# Altium schematic symbol library Minh_Lib.SchLib: 619 symbols (part 2 of 4) (continued)
## CDRH127NP-120MC
designator H?  Supplier Part Number 1: 308-1459-1-ND
Ind Power Shielded Wirewound 12uH 20% 1KHz Ferrite 4.9A Carrier T/R; Manufacturer: Sumida; Manufacturer Part Number: CDRH127NP-120MC; DC Resistance (DCR): 24.3mR; Supplier 1: Digi-Key; RoHS: Yes; Category: Fixed Inductors; Stock 1: 8232; Pricing 1: 1=2.10000, 10=1.93400, 25=1.77280, 50=1.51500, 100=1.35390, 250=1.16048 (USD); Mount: Surface Mount; Case/Package: Nonstandard; Core Material: Ferrite; Weight: 0.126986oz; Min Operating Temperature: -40°C; Max Operating Temperature: 100°C; Tolerance: 20%; Shielding: Shielded; Package Quantity: 1; Packaging: Tape and Reel; Current Rating: 4.9A; Inductance: 12uH; Max DC Current: 4.9A; Termination: SMD/SMT; Test Frequency: 1kHz; DC Current: 4.9A; Series: CDRH127; Rated Current-Max: 4.9A; Length: 12.3mm; Width: 12.3mm; Height: 8mm; Height - Seated (Max): 0.315inch; Depth: 12.3mm; Radiation Hardening: No; Military Standard: Not; Lead Free: Lead Free; RoHS Compliant: Yes; ComponentLink1URL: https://datasheet.ciiva.com/18168/getdatasheetpartid-357348-18168762.pdf?src-supplier=Verical; ComponentLink1Description: https://datasheet.ciiva.com/18168/getdatasheetpartid-357348-18168762.pdf?src-supplier=Verical
footprint CDRH127NP (Inductor)
pins: 1, 2

## CDRH127NP-121MC
designator H?  Supplier Part Number 1: 308-1460-1-ND
Ind Power Shielded Wirewound 120uH 20% 1KHz Ferrite 1.6A Carrier T/R; Manufacturer: Sumida; Manufacturer Part Number: CDRH127NP-121MC; DC Resistance (DCR): 250mR; Supplier 1: Digi-Key; RoHS: Yes; Category: Fixed Inductors; Stock 1: 505; Pricing 1: 1=2.10000, 10=1.93400, 25=1.77280, 50=1.51500, 100=1.35390, 250=1.16048 (USD); Mount: Surface Mount; Case/Package: Nonstandard; Weight: 0.126986oz; Core Material: Ferrite; Min Operating Temperature: -40°C; Max Operating Temperature: 100°C; Package Quantity: 1; Current Rating: 1.6A; Tolerance: 20%; Shielding: Shielded; Packaging: Tape and Reel; Inductance: 120uH; Test Frequency: 1kHz; Max DC Current: 1.6A; Termination: SMD/SMT; Length: 0.472inch; Width: 0.472inch; Height: 8mm; Height - Seated (Max): 0.315inch; Depth: 12.3mm; Radiation Hardening: No; Lead Free: Lead Free; ComponentLink1URL: http://www.sumida.com/products/pdf/CDRH127.pdf?src-supplier=Avnet; ComponentLink1Description: http://www.sumida.com/products/pdf/CDRH127.pdf?src-supplier=Avnet; ComponentLink2URL: http://products.sumida.com/products/pdf/CDRH127.pdf?src-supplier=Digi-Key; ComponentLink2Description: http://products.sumida.com/products/pdf/CDRH127.pdf?src-supplier=Digi-Key; ComponentLink3URL: http://www.sumida.com/products/pdf/CDRH127,127LD.pdf?src-supplier=Future+Electronics; ComponentLink3Description: http://www.sumida.com/products/pdf/CDRH127,127LD.pdf?src-supplier=Future+Electronics; ComponentLink4URL: http://www.sumida.com/products/pdf/CDRH127.pdf?src-supplier=Mouser; ComponentLink4Description: http://www.sumida.com/products/pdf/CDRH127.pdf?src-supplier=Mouser
footprint CDRH127NP (Inductor)
pins: 1, 2

## CDRH127NP-150MC
designator H?  Supplier Part Number 1: 308-1461-1-ND
Inductor Power Shielded Drum Core 15uH 20% 1KHz Ferrite 4.5A 27mOhm DCR Carrier T/R; Manufacturer: Sumida; Manufacturer Part Number: CDRH127NP-150MC; DC Resistance (DCR): 27mR; Supplier 1: Digi-Key; RoHS: Yes; Category: Fixed Inductors; Stock 1: 4348; Pricing 1: 1=2.10000, 10=1.93400, 25=1.77280, 50=1.51500, 100=1.35390, 250=1.16048 (USD); Mount: Surface Mount; Case/Package: Nonstandard; Core Material: Ferrite; Weight: 0.126986oz; Min Operating Temperature: -40°C; Max Operating Temperature: 100°C; Package Quantity: 1; Current Rating: 4.5A; Tolerance: 20%; Shielding: Shielded; Packaging: Tape and Reel; Inductance: 15uH; Test Frequency: 1kHz; Max DC Current: 4.5A; Termination: SMD/SMT; DC Current: 4.5A; Length: 12.3mm; Width: 0.472inch; Height: 8mm; Height - Seated (Max): 0.315inch; Depth: 12.3mm; Radiation Hardening: No; Military Standard: Not; Lead Free: Lead Free; ComponentLink1URL: http://components.arrow.com/part/dataview/51004581S8883429N4456?src-supplier=Arrow+Electronics; ComponentLink1Description: http://components.arrow.com/part/dataview/51004581S8883429N4456?src-supplier=Arrow+Electronics; ComponentLink2URL: http://products.sumida.com/products/pdf/CDRH127.pdf?src-supplier=Digi-Key; ComponentLink2Description: http://products.sumida.com/products/pdf/CDRH127.pdf?src-supplier=Digi-Key; ComponentLink3URL: http://www.sumida.com/products/pdf/CDRH127,127LD.pdf?src-supplier=Future+Electronics; ComponentLink3Description: http://www.sumida.com/products/pdf/CDRH127,127LD.pdf?src-supplier=Future+Electronics; ComponentLink4URL: http://www.sumida.com/products/pdf/CDRH127.pdf?src-supplier=Avnet; ComponentLink4Description: http://www.sumida.com/products/pdf/CDRH127.pdf?src-supplier=Avnet; ComponentLink5URL: http://www.sumida.com/products/pdf/CDRH127.pdf?src-supplier=Mouser; ComponentLink5Description: http://www.sumida.com/products/pdf/CDRH127.pdf?src-supplier=Mouser; ComponentLink6URL: https://www.verical.com/server-webapp/html/getDatasheet?partID=358322&src-supplier=Verical; ComponentLink6Description: https://www.verical.com/server-webapp/html/getDatasheet?partID=358322&src-supplier=Verical
footprint CDRH127NP (Inductor)
pins: 1, 2

## CDRH127NP-151MC
designator H?  Supplier Part Number 1: 308-1462-1-ND
Ind Power Shielded Wirewound 150uH 20% 1KHz Ferrite 1.42A Carrier T/R; Manufacturer: Sumida; Manufacturer Part Number: CDRH127NP-151MC; DC Resistance (DCR): 280mR; Supplier 1: Digi-Key; RoHS: Yes; Category: Fixed Inductors; Stock 1: 9860; Pricing 1: 1=2.10000, 10=1.93400, 25=1.77280, 50=1.51500, 100=1.35390, 250=1.16048 (USD); Mount: Surface Mount; Case/Package: Nonstandard; Core Material: Ferrite; Min Operating Temperature: -40°C; Max Operating Temperature: 100°C; Package Quantity: 1; Current Rating: 1.42A; Tolerance: 20%; Shielding: Shielded; Packaging: Tape and Reel; Inductance: 150uH; Test Frequency: 1kHz; Max DC Current: 1.42A; Termination: SMD/SMT; DC Current: 1.42A; Series: CDRH127; Rated Current-Max: 1.42A; Length: 12.3mm; Width: 0.472inch; Height: 8mm; Height - Seated (Max): 0.315inch; Depth: 12.3mm; Radiation Hardening: No; Military Standard: Not; Lead Free: Lead Free; RoHS Compliant: Yes; ComponentLink1URL: https://www.verical.com/server-webapp/html/getDatasheet?partID=358465&src-supplier=Verical; ComponentLink1Description: https://www.verical.com/server-webapp/html/getDatasheet?partID=358465&src-supplier=Verical; ComponentLink2URL: http://www.mouser.com/ds/2/390/CDRH127,127LD-514245.pdf?src-supplier=Mouser; ComponentLink2Description: http://www.mouser.com/ds/2/390/CDRH127,127LD-514245.pdf?src-supplier=Mouser; ComponentLink3URL: http://components.arrow.com/part/dataview/51287426S9072162N4456?src-supplier=Arrow+Electronics; ComponentLink3Description: http://components.arrow.com/part/dataview/51287426S9072162N4456?src-supplier=Arrow+Electronics; ComponentLink4URL: http://products.sumida.com/products/pdf/CDRH127.pdf?src-supplier=Digi-Key; ComponentLink4Description: http://products.sumida.com/products/pdf/CDRH127.pdf?src-supplier=Digi-Key; ComponentLink5URL: http://www.sumida.com/products/pdf/CDRH127.pdf?src-supplier=Avnet; ComponentLink5Description: http://www.sumida.com/products/pdf/CDRH127.pdf?src-supplier=Avnet; ComponentLink6URL: http://www.sumida.com/products/pdf/CDRH127,127LD.pdf?src-supplier=Future+Electronics; ComponentLink6Description: http://www.sumida.com/products/pdf/CDRH127,127LD.pdf?src-supplier=Future+Electronics
footprint CDRH127NP (Inductor)
pins: 1, 2

## CDRH127NP-180MC
designator H?  Supplier Part Number 1: CDRH127NP-180MC
Ind Power Shielded Wirewound 18uH 20% 1KHz Ferrite 3.9A Carrier T/R; Manufacturer: Sumida; DC Resistance (DCR): 39.2mR; Supplier 1: Arrow Electronics; Manufacturer Part Number: CDRH127NP-180MC; RoHS: Yes; Category: Fixed Inductors; Stock 1: 500; Pricing 1: 1=1.81010, 10=1.68900, 25=1.50010, 100=1.25390, 250=1.09350, 500=1.03260 (USD); Mount: Surface Mount; Case/Package: Nonstandard; Core Material: Ferrite; Weight: 0.126986oz; Min Operating Temperature: -40°C; Max Operating Temperature: 100°C; Package Quantity: 1; Current Rating: 3.9A; Tolerance: 20%; Shielding: Shielded; Packaging: Tape and Reel; Inductance: 18uH; Test Frequency: 1kHz; Max DC Current: 3.9A; Termination: SMD/SMT; DC Current: 3.9A; Length: 12.3mm; Width: 0.472inch; Height: 8mm; Height - Seated (Max): 0.315inch; Depth: 12.3mm; Radiation Hardening: No; Lead Free: Lead Free; Military Standard: Not; ComponentLink1URL: http://components.arrow.com/part/dataview/51004679S8883430N4456?src-supplier=Arrow+Electronics; ComponentLink1Description: http://components.arrow.com/part/dataview/51004679S8883430N4456?src-supplier=Arrow+Electronics; ComponentLink2URL: http://products.sumida.com/products/pdf/CDRH127.pdf?src-supplier=Digi-Key; ComponentLink2Description: http://products.sumida.com/products/pdf/CDRH127.pdf?src-supplier=Digi-Key; ComponentLink3URL: http://www.sumida.com/products/pdf/CDRH127,127LD.pdf?src-supplier=Future+Electronics; ComponentLink3Description: http://www.sumida.com/products/pdf/CDRH127,127LD.pdf?src-supplier=Future+Electronics; ComponentLink4URL: http://www.sumida.com/products/pdf/CDRH127.pdf?src-supplier=Avnet; ComponentLink4Description: http://www.sumida.com/products/pdf/CDRH127.pdf?src-supplier=Avnet; ComponentLink5URL: http://www.sumida.com/products/pdf/CDRH127.pdf?src-supplier=Mouser; ComponentLink5Description: http://www.sumida.com/products/pdf/CDRH127.pdf?src-supplier=Mouser; ComponentLink6URL: https://www.verical.com/server-webapp/html/getDatasheet?partID=359500&src-supplier=Verical; ComponentLink6Description: https://www.verical.com/server-webapp/html/getDatasheet?partID=359500&src-supplier=Verical
footprint CDRH127NP (Inductor)
pins: 1, 2

## CDRH127NP-181MC
designator H?  Supplier Part Number 1: CDRH127NP-181MC
Ind Power Shielded Wirewound 180uH 20% 1KHz Ferrite 1.3A; Manufacturer: Sumida; DC Resistance (DCR): 350mR; Supplier 1: Avnet; Manufacturer Part Number: CDRH127NP-181MC; RoHS: Yes; Category: Fixed Inductors; Pricing 1: 500=0.87188, 1000=0.85960, 2000=0.83504, 3000=0.81662, 4000=0.78592, 5000=0.76750, 50000=0.61366 (USD); Mount: Surface Mount; Case/Package: Nonstandard; Core Material: Ferrite; Weight: 0.126986oz; Min Operating Temperature: -40°C; Max Operating Temperature: 100°C; Package Quantity: 500; Packaging: Tape and Reel; Tolerance: 20%; Shielding: Shielded; Current Rating: 1.3A; Inductance: 180uH; Max DC Current: 1.3A; Termination: SMD/SMT; Test Frequency: 1kHz; Series: CDRH127; Length: 0.472inch; Width: 12.3mm; Height: 8mm; Height - Seated (Max): 0.315inch; Depth: 12.3mm; Radiation Hardening: No; Lead Free: Lead Free; RoHS Compliant: Yes; ComponentLink1URL: http://www.sumida.com/products/pdf/CDRH127.pdf?src-supplier=Mouser; ComponentLink1Description: http://www.sumida.com/products/pdf/CDRH127.pdf?src-supplier=Mouser; ComponentLink2URL: http://www.sumida.com/products/pdf/CDRH127,127LD.pdf?src-supplier=Avnet; ComponentLink2Description: http://www.sumida.com/products/pdf/CDRH127,127LD.pdf?src-supplier=Avnet; ComponentLink3URL: http://products.sumida.com/products/pdf/CDRH127.pdf?src-supplier=Digi-Key; ComponentLink3Description: http://products.sumida.com/products/pdf/CDRH127.pdf?src-supplier=Digi-Key
footprint CDRH127NP (Inductor)
pins: 1, 2

## CDRH127NP-220MC
designator H?  Supplier Part Number 1: 308-1464-1-ND
Ind Power Shielded Wirewound 22uH 20% 1KHz Ferrite 3.6A Carrier T/R; Manufacturer: Sumida; Manufacturer Part Number: CDRH127NP-220MC; DC Resistance (DCR): 43.2mR; Supplier 1: Digi-Key; RoHS: Yes; Category: Fixed Inductors; Stock 1: 1552; Pricing 1: 1=2.10000, 10=1.93400, 25=1.77280, 50=1.51500, 100=1.35390, 250=1.16048 (USD); Mount: Surface Mount; Case/Package: Nonstandard; Core Material: Ferrite; Min Operating Temperature: -40°C; Max Operating Temperature: 100°C; Current Rating: 3.6A; Tolerance: 20%; Shielding: Shielded; Packaging: Tape and Reel; Package Quantity: 1; Inductance: 22uH; Max DC Current: 3.6A; Termination: SMD/SMT; Test Frequency: 1kHz; DC Current: 3.6A; Series: CDRH127; Rated Current-Max: 3.6A; Length: 12.3mm; Width: 12.3mm; Height: 8mm; Height - Seated (Max): 0.315inch; Depth: 12.3mm; Radiation Hardening: No; Military Standard: Not; Lead Free: Lead Free; RoHS Compliant: Yes; ComponentLink1URL: http://components.arrow.com/part/dataview/47069231S8883431N4456?src-supplier=Arrow+Electronics; ComponentLink1Description: http://components.arrow.com/part/dataview/47069231S8883431N4456?src-supplier=Arrow+Electronics; ComponentLink2URL: https://www.verical.com/server-webapp/html/getDatasheet?partID=358323&src-supplier=Verical; ComponentLink2Description: https://www.verical.com/server-webapp/html/getDatasheet?partID=358323&src-supplier=Verical; ComponentLink3URL: http://www.sumida.com/products/pdf/CDRH127.pdf?src-supplier=Mouser; ComponentLink3Description: http://www.sumida.com/products/pdf/CDRH127.pdf?src-supplier=Mouser; ComponentLink4URL: http://products.sumida.com/products/pdf/CDRH127.pdf?src-supplier=Digi-Key; ComponentLink4Description: http://products.sumida.com/products/pdf/CDRH127.pdf?src-supplier=Digi-Key; ComponentLink5URL: http://www.sumida.com/products/pdf/CDRH127.pdf?src-supplier=Avnet; ComponentLink5Description: http://www.sumida.com/products/pdf/CDRH127.pdf?src-supplier=Avnet; ComponentLink6URL: http://www.sumida.com/products/pdf/CDRH127,127LD.pdf?src-supplier=Future+Electronics; ComponentLink6Description: http://www.sumida.com/products/pdf/CDRH127,127LD.pdf?src-supplier=Future+Electronics
footprint CDRH127NP (Inductor)
pins: 1, 2

## CDRH127NP-221MC
designator H?  Supplier Part Number 1: 308-1465-1-ND
Ind Power Shielded Wirewound 220uH 20% 1KHz Ferrite 1.16A Carrier T/R; Manufacturer: Sumida; Manufacturer Part Number: CDRH127NP-221MC; DC Resistance (DCR): 390mR; Supplier 1: Digi-Key; RoHS: Yes; Category: Fixed Inductors; Stock 1: 9227; Pricing 1: 1=2.10000, 10=1.93400, 25=1.77280, 50=1.51500, 100=1.35390, 250=1.16048 (USD); Mount: Surface Mount; Case/Package: Nonstandard; Core Material: Ferrite; Weight: 0.126986oz; Min Operating Temperature: -40°C; Max Operating Temperature: 100°C; Packaging: Tape and Reel; Tolerance: 20%; Shielding: Shielded; Package Quantity: 1; Current Rating: 1.16A; Inductance: 220uH; Test Frequency: 1kHz; Max DC Current: 1.16A; Termination: SMD/SMT; DC Current: 1.16A; Series: CDRH127; Rated Current-Max: 1.16A; Length: 12.3mm; Width: 0.472inch; Height: 8mm; Height - Seated (Max): 0.315inch; Depth: 12.3mm; Radiation Hardening: No; Military Standard: Not; Lead Free: Lead Free; RoHS Compliant: Yes; ComponentLink1URL: https://datasheet.ciiva.com/26946/getdatasheetpartid-359501-26946643.pdf?src-supplier=Verical; ComponentLink1Description: https://datasheet.ciiva.com/26946/getdatasheetpartid-359501-26946643.pdf?src-supplier=Verical
footprint CDRH127NP (Inductor)
pins: 1, 2

## CDRH127NP-270MC
designator H?  Supplier Part Number 1: 308-1466-1-ND
Ind Power Shielded Wirewound 27uH 20% 1KHz Ferrite 3.4A Carrier T/R; Manufacturer: Sumida; Manufacturer Part Number: CDRH127NP-270MC; DC Resistance (DCR): 45.9mR; Supplier 1: Digi-Key; RoHS: Yes; Category: Fixed Inductors; Stock 1: 1209; Pricing 1: 1=2.10000, 10=1.93400, 25=1.77280, 50=1.51500, 100=1.35390, 250=1.16048 (USD); Mount: Surface Mount; Case/Package: Nonstandard; Core Material: Ferrite; Min Operating Temperature: -40°C; Max Operating Temperature: 100°C; Shielding: Shielded; Tolerance: 20%; Package Quantity: 1; Current Rating: 3.4A; Packaging: Tape and Reel; Inductance: 27uH; Test Frequency: 1kHz; Max DC Current: 3.4A; Termination: SMD/SMT; DC Current: 3.4A; Series: CDRH127; Rated Current-Max: 3.4A; Length: 12.3mm; Width: 0.472inch; Height: 8mm; Height - Seated (Max): 0.315inch; Depth: 12.3mm; Radiation Hardening: No; Military Standard: Not; Lead Free: Lead Free; RoHS Compliant: Yes; ComponentLink1URL: https://datasheet.ciiva.com/26946/getdatasheetpartid-358324-26946644.pdf?src-supplier=Verical; ComponentLink1Description: https://datasheet.ciiva.com/26946/getdatasheetpartid-358324-26946644.pdf?src-supplier=Verical
footprint CDRH127NP (Inductor)
pins: 1, 2

## CDRH127NP-271MC
designator H?  Supplier Part Number 1: 851-CDRH127NP-271MC
FIXED IND 270UH 1.06A 560 MOHM; Manufacturer: Sumida; Manufacturer Part Number: CDRH127NP-271MC; Core Material: Ferrite; Tolerance: 20%; Shielding: Shielded; DC Resistance (DCR): 560mR; Test Frequency: 1kHz; Supplier 1: Mouser; RoHS: Yes; Category: Fixed Inductors; Stock 1: 155; Pricing 1: 1=2.10000, 10=1.93000, 50=1.93000, 100=1.35000, 1000=0.97800, 10000=0.94300 (USD); Mount: Surface Mount; Case/Package: Nonstandard; Min Operating Temperature: -40°C; Max Operating Temperature: 100°C; Package Quantity: 500; Packaging: Tape and Reel; Current Rating: 1.06A; Inductance: 270uH; Max DC Current: 1.06A; Termination: SMD/SMT; Series: CDRH127; Length: 0.472inch; Width: 0.472inch; Height: 8mm; Height - Seated (Max): 0.315inch; Depth: 12.3mm; Radiation Hardening: No; Lead Free: Lead Free; RoHS Compliant: Yes; ComponentLink1URL: http://products.sumida.com/products/pdf/CDRH127.pdf?src-supplier=Digi-Key; ComponentLink1Description: http://products.sumida.com/products/pdf/CDRH127.pdf?src-supplier=Digi-Key; ComponentLink2URL: http://www.sumida.com/products/pdf/CDRH127.pdf?src-supplier=Mouser; ComponentLink2Description: http://www.sumida.com/products/pdf/CDRH127.pdf?src-supplier=Mouser; ComponentLink3URL: http://www.sumida.com/products/pdf/CDRH127.pdf?src-supplier=Avnet; ComponentLink3Description: http://www.sumida.com/products/pdf/CDRH127.pdf?src-supplier=Avnet
footprint CDRH127NP (Inductor)
pins: 1, 2

## CDRH127NP-330MC
designator H?  Supplier Part Number 1: CDRH127NP-330MC
FIXED IND 33UH 3A 64.8 MOHM SMD; Manufacturer: Sumida; Core Material: Ferrite; Tolerance: 20%; Shielding: Shielded; DC Resistance (DCR): 64.8mR; Test Frequency: 1kHz; Supplier 1: Avnet; Manufacturer Part Number: CDRH127NP-330MC; RoHS: Yes; Category: Fixed Inductors; Stock 1: 500; Pricing 1: 500=0.87188, 1000=0.85960, 2000=0.83504, 3000=0.81662, 4000=0.78592, 5000=0.76750, 50000=0.61366 (USD); Mount: Surface Mount; Case/Package: Nonstandard; Weight: 0.126986oz; Min Operating Temperature: -40°C; Max Operating Temperature: 100°C; Packaging: Tape and Reel; Package Quantity: 1; Current Rating: 3A; Inductance: 33uH; Max DC Current: 3A; Termination: SMD/SMT; DC Current: 3A; Series: CDRH127; Rated Current-Max: 3A; Length: 12.3mm; Width: 0.472inch; Height: 8mm; Height - Seated (Max): 0.315inch; Depth: 12.3mm; Radiation Hardening: No; Military Standard: Not; Lead Free: Lead Free; RoHS Compliant: Yes; ComponentLink1URL: http://components.arrow.com/part/dataview/51004637S8883439N4456?src-supplier=Arrow+Electronics; ComponentLink1Description: http://components.arrow.com/part/dataview/51004637S8883439N4456?src-supplier=Arrow+Electronics; ComponentLink2URL: http://products.sumida.com/products/pdf/CDRH127.pdf?src-supplier=Digi-Key; ComponentLink2Description: http://products.sumida.com/products/pdf/CDRH127.pdf?src-supplier=Digi-Key; ComponentLink3URL: http://www.sumida.com/products/pdf/CDRH127.pdf?src-supplier=Mouser; ComponentLink3Description: http://www.sumida.com/products/pdf/CDRH127.pdf?src-supplier=Mouser; ComponentLink4URL: http://www.sumida.com/products/pdf/CDRH127.pdf?src-supplier=Avnet; ComponentLink4Description: http://www.sumida.com/products/pdf/CDRH127.pdf?src-supplier=Avnet; ComponentLink5URL: http://www.sumida.com/products/pdf/CDRH127,127LD.pdf?src-supplier=Future+Electronics; ComponentLink5Description: http://www.sumida.com/products/pdf/CDRH127,127LD.pdf?src-supplier=Future+Electronics; ComponentLink6URL: https://www.verical.com/server-webapp/html/getDatasheet?partID=353985&src-supplier=Verical; ComponentLink6Description: https://www.verical.com/server-webapp/html/getDatasheet?partID=353985&src-supplier=Verical
footprint CDRH127NP (Inductor)
pins: 1, 2

## CDRH127NP-331MC
designator H?  Supplier Part Number 1: 308-1468-1-ND
Inductor Power Shielded Drum Core 330uH 20% 1KHz Ferrite 950mA 640mOhm DCR Carrier T/R; Manufacturer: Sumida; Manufacturer Part Number: CDRH127NP-331MC; DC Resistance (DCR): 640mR; Supplier 1: Digi-Key; RoHS: Yes; Category: Fixed Inductors; Stock 1: 2; Pricing 1: 1=2.10000, 10=1.93400, 25=1.77280, 50=1.51500, 100=1.35390, 250=1.16048 (USD); Mount: Surface Mount; Case/Package: Nonstandard; Core Material: Ferrite; Weight: 0.126986oz; Min Operating Temperature: -40°C; Max Operating Temperature: 100°C; Tolerance: 20%; Shielding: Shielded; Packaging: Tape and Reel; Package Quantity: 1; Current Rating: 950mA; Inductance: 330uH; Test Frequency: 1kHz; Max DC Current: 950mA; Termination: SMD/SMT; DC Current: 950mA; Series: CDRH127; Rated Current-Max: 950mA; Length: 12.3mm; Width: 0.472inch; Height: 8mm; Height - Seated (Max): 0.315inch; Depth: 12.3mm; Radiation Hardening: No; Military Standard: Not; Lead Free: Lead Free; RoHS Compliant: Yes; ComponentLink1URL: http://components.arrow.com/part/dataview/51004599S8961786N4456?src-supplier=Arrow+Electronics; ComponentLink1Description: http://components.arrow.com/part/dataview/51004599S8961786N4456?src-supplier=Arrow+Electronics; ComponentLink2URL: https://www.verical.com/server-webapp/html/getDatasheet?partID=359502&src-supplier=Verical; ComponentLink2Description: https://www.verical.com/server-webapp/html/getDatasheet?partID=359502&src-supplier=Verical; ComponentLink3URL: http://www.sumida.com/products/pdf/CDRH127.pdf?src-supplier=Avnet; ComponentLink3Description: http://www.sumida.com/products/pdf/CDRH127.pdf?src-supplier=Avnet; ComponentLink4URL: http://www.sumida.com/products/pdf/CDRH127,127LD.pdf?src-supplier=Future+Electronics; ComponentLink4Description: http://www.sumida.com/products/pdf/CDRH127,127LD.pdf?src-supplier=Future+Electronics; ComponentLink5URL: http://products.sumida.com/products/pdf/CDRH127.pdf?src-supplier=Digi-Key; ComponentLink5Description: http://products.sumida.com/products/pdf/CDRH127.pdf?src-supplier=Digi-Key; ComponentLink6URL: http://www.sumida.com/products/pdf/CDRH127.pdf?src-supplier=Mouser; ComponentLink6Description: http://www.sumida.com/products/pdf/CDRH127.pdf?src-supplier=Mouser
footprint CDRH127NP (Inductor)
pins: 1, 2

## CDRH127NP-390MC
designator H?  Supplier Part Number 1: 8983165
Inductor Power Shielded Drum Core 39uH 20% 1KHz Ferrite 2.75A 72.9mOhm DCR Carrier T/R; Manufacturer: Sumida; Manufacturer Part Number: CDRH127NP-390MC; Number of Terminals/Pins: 4; DC Resistance (DCR): 72.9mR; Supplier 1: Future Electronics; RoHS: Yes; Category: Fixed Inductors; Pricing 1: 500=0.97000, 1000=0.95000, 1500=0.93500, 2000=0.92500, 2500=0.89500 (USD); Mount: Surface Mount; Case/Package: Nonstandard; Core Material: Ferrite; Min Operating Temperature: -40°C; Max Operating Temperature: 100°C; Package Quantity: 1; Current Rating: 2.75A; Tolerance: 20%; Shielding: Shielded; Packaging: Tape and Reel; Inductance: 39uH; Test Frequency: 1kHz; Max DC Current: 2.75A; Termination: SMD/SMT; DC Current: 2.75A; Series: CDRH127; Rated Current-Max: 2.75A; Moisture Sensitivity Level: 1; Length: 12.3mm; Width: 0.472inch; Height: 8mm; Height - Seated (Max): 0.315inch; Depth: 12.3mm; Radiation Hardening: No; Military Standard: Not; Lead Free: Lead Free; RoHS Compliant: Yes; ComponentLink1URL: https://datasheet.ciiva.com/18168/getdatasheetpartid-357362-18168775.pdf?src-supplier=Verical; ComponentLink1Description: https://datasheet.ciiva.com/18168/getdatasheetpartid-357362-18168775.pdf?src-supplier=Verical
footprint CDRH127NP (Inductor)
pins: 1, 2

## CDRH127NP-391MC
designator H?  Supplier Part Number 1: 851-CDRH127NP-391MC
FIXED IND 390UH 880MA 700 MOHM; Manufacturer: Sumida; Manufacturer Part Number: CDRH127NP-391MC; Core Material: Ferrite; DC Resistance (DCR): 700mR; Test Frequency: 1kHz; Tolerance: 20%; Shielding: Shielded; Supplier 1: Mouser; RoHS: Yes; Category: Fixed Inductors; Stock 1: 225; Pricing 1: 1=2.10000, 10=1.93000, 50=1.93000, 100=1.35000, 1000=1.03000, 10000=1.00000 (USD); Mount: Surface Mount; Case/Package: Nonstandard; Weight: 0.126986oz; Min Operating Temperature: -40°C; Max Operating Temperature: 100°C; Inductance: 390uH; Max DC Current: 880mA; Termination: SMD/SMT; Package Quantity: 500; Packaging: Tape and Reel; Current Rating: 880mA; Length: 0.472inch; Width: 12.3mm; Height: 8mm; Height - Seated (Max): 0.315inch; Depth: 12.3mm; Radiation Hardening: No; Lead Free: Lead Free; ComponentLink1URL: http://www.sumida.com/products/pdf/CDRH127.pdf?src-supplier=Mouser; ComponentLink1Description: http://www.sumida.com/products/pdf/CDRH127.pdf?src-supplier=Mouser; ComponentLink2URL: http://products.sumida.com/products/pdf/CDRH127.pdf?src-supplier=Digi-Key; ComponentLink2Description: http://products.sumida.com/products/pdf/CDRH127.pdf?src-supplier=Digi-Key; ComponentLink3URL: http://www.sumida.com/products/pdf/CDRH127.pdf?src-supplier=Avnet; ComponentLink3Description: http://www.sumida.com/products/pdf/CDRH127.pdf?src-supplier=Avnet
footprint CDRH127NP (Inductor)
pins: 1, 2

## CDRH127NP-470MC
designator H?  Supplier Part Number 1: 3804572
Ind Power Shielded Wirewound 47uH 20% 1KHz Ferrite 2.5A Carrier T/R; Manufacturer: Sumida; Manufacturer Part Number: CDRH127NP-470MC; DC Resistance (DCR): 100mR; Supplier 1: Future Electronics; RoHS: Yes; Category: Fixed Inductors; Pricing 1: 500=1.13000, 1000=1.11000, 1500=1.10000, 2000=1.09000, 2500=1.07000 (USD); Mount: Surface Mount; Case/Package: Nonstandard; Core Material: Ferrite; Min Operating Temperature: -40°C; Max Operating Temperature: 100°C; Package Quantity: 1; Packaging: Tape and Reel; Tolerance: 20%; Shielding: Shielded; Current Rating: 2.5A; Inductance: 47uH; Max DC Current: 2.5A; Termination: SMD/SMT; Test Frequency: 1kHz; DC Current: 2.5A; Series: CDRH127; Rated Current-Max: 2.5A; Length: 12.3mm; Width: 12.3mm; Height: 8mm; Height - Seated (Max): 0.315inch; Depth: 12.3mm; Radiation Hardening: No; Military Standard: Not; Lead Free: Lead Free; RoHS Compliant: Yes; ComponentLink1URL: https://datasheet.ciiva.com/26835/getdatasheetpartid-359516-26835142.pdf?src-supplier=Verical; ComponentLink1Description: https://datasheet.ciiva.com/26835/getdatasheetpartid-359516-26835142.pdf?src-supplier=Verical
footprint CDRH127NP (Inductor)
pins: 1, 2

## CDRH127NP-471MC
designator H?  Supplier Part Number 1: 308-1472-1-ND
FIXED IND 470UH 790MA 980 MOHM; Manufacturer: Sumida; Manufacturer Part Number: CDRH127NP-471MC; Core Material: Ferrite; Tolerance: 20%; Shielding: Shielded; DC Resistance (DCR): 980mR; Test Frequency: 1kHz; Supplier 1: Digi-Key; RoHS: Yes; Category: Fixed Inductors; Stock 1: 563; Pricing 1: 1=2.10000, 10=1.93400, 25=1.77280, 50=1.51500, 100=1.35390, 250=1.16048 (USD); Mount: Surface Mount; Case/Package: Nonstandard; Weight: 0.126986oz; Min Operating Temperature: -40°C; Max Operating Temperature: 100°C; Package Quantity: 1; Current Rating: 790mA; Packaging: Tape and Reel; Inductance: 470uH; Max DC Current: 790mA; Termination: SMD/SMT; DC Current: 790mA; Series: CDRH127; Rated Current-Max: 790mA; Length: 12.3mm; Width: 0.472inch; Height: 8mm; Height - Seated (Max): 0.315inch; Depth: 12.3mm; Radiation Hardening: No; Military Standard: Not; Lead Free: Lead Free; RoHS Compliant: Yes; ComponentLink1URL: http://components.arrow.com/part/dataview/57636756S514210N4456?src-supplier=Arrow+Electronics; ComponentLink1Description: http://components.arrow.com/part/dataview/57636756S514210N4456?src-supplier=Arrow+Electronics; ComponentLink2URL: http://products.sumida.com/products/pdf/CDRH127.pdf?src-supplier=Digi-Key; ComponentLink2Description: http://products.sumida.com/products/pdf/CDRH127.pdf?src-supplier=Digi-Key; ComponentLink3URL: http://www.sumida.com/products/pdf/CDRH127.pdf?src-supplier=Mouser; ComponentLink3Description: http://www.sumida.com/products/pdf/CDRH127.pdf?src-supplier=Mouser; ComponentLink4URL: http://www.sumida.com/products/pdf/CDRH127.pdf?src-supplier=Avnet; ComponentLink4Description: http://www.sumida.com/products/pdf/CDRH127.pdf?src-supplier=Avnet; ComponentLink5URL: http://www.sumida.com/products/pdf/CDRH127,127LD.pdf?src-supplier=Future+Electronics; ComponentLink5Description: http://www.sumida.com/products/pdf/CDRH127,127LD.pdf?src-supplier=Future+Electronics
footprint CDRH127NP (Inductor)
pins: 1, 2

## CDRH127NP-560MC
designator H?  Supplier Part Number 1: 308-1474-1-ND
Inductor Power Shielded Wirewound 56uH 20% 1KHz Ferrite 2.35A 110mOhm DCR Carrier T/R; Manufacturer: Sumida; Manufacturer Part Number: CDRH127NP-560MC; DC Resistance (DCR): 110mR; Supplier 1: Digi-Key; RoHS: Yes; Category: Fixed Inductors; Stock 1: 140; Pricing 1: 1=2.10000, 10=1.93400, 25=1.77280, 50=1.51500, 100=1.35390, 250=1.16048 (USD); Mount: Surface Mount; Case/Package: Nonstandard; Core Material: Ferrite; Min Operating Temperature: -40°C; Max Operating Temperature: 100°C; Package Quantity: 1; Current Rating: 2.35A; Tolerance: 20%; Shielding: Shielded; Packaging: Tape and Reel; Inductance: 56uH; Test Frequency: 1kHz; Max DC Current: 2.35A; Termination: SMD/SMT; DC Current: 2.35A; Series: CDRH127; Rated Current-Max: 2.35A; Length: 12.3mm; Width: 0.472inch; Height: 8mm; Height - Seated (Max): 0.315inch; Depth: 12.3mm; Radiation Hardening: No; Military Standard: Not; Lead Free: Lead Free; RoHS Compliant: Yes; ComponentLink1URL: https://datasheet.ciiva.com/18168/getdatasheetpartid-358339-18168778.pdf?src-supplier=Verical; ComponentLink1Description: https://datasheet.ciiva.com/18168/getdatasheetpartid-358339-18168778.pdf?src-supplier=Verical
footprint CDRH127NP (Inductor)
pins: 1, 2

## CDRH127NP-561MC
designator H?  Supplier Part Number 1: CDRH127NP-561MC
FIXED IND 560UH 730MA 1.07 OHM; Manufacturer: Sumida; Core Material: Ferrite; Tolerance: 20%; Shielding: Shielded; DC Resistance (DCR): 1.07R; Test Frequency: 1kHz; Supplier 1: Avnet; Manufacturer Part Number: CDRH127NP-561MC; RoHS: Yes; Category: Fixed Inductors; Pricing 1: 500=0.87188, 1000=0.85960, 2000=0.83504, 3000=0.81662, 4000=0.78592, 5000=0.76750, 50000=0.61366 (USD); Mount: Surface Mount; Case/Package: Nonstandard; Weight: 0.126986oz; Min Operating Temperature: -40°C; Max Operating Temperature: 100°C; Packaging: Tape and Reel; Package Quantity: 500; Current Rating: 730mA; Inductance: 560uH; Max DC Current: 730mA; Termination: SMD/SMT; Series: CDRH127; Length: 0.472inch; Width: 0.472inch; Height: 8mm; Height - Seated (Max): 0.315inch; Depth: 12.3mm; Radiation Hardening: No; Lead Free: Lead Free; RoHS Compliant: Yes; ComponentLink1URL: http://www.sumida.com/products/pdf/CDRH127.pdf?src-supplier=Avnet; ComponentLink1Description: http://www.sumida.com/products/pdf/CDRH127.pdf?src-supplier=Avnet; ComponentLink2URL: http://products.sumida.com/products/pdf/CDRH127.pdf?src-supplier=Digi-Key; ComponentLink2Description: http://products.sumida.com/products/pdf/CDRH127.pdf?src-supplier=Digi-Key; ComponentLink3URL: http://www.sumida.com/products/pdf/CDRH127.pdf?src-supplier=Mouser; ComponentLink3Description: http://www.sumida.com/products/pdf/CDRH127.pdf?src-supplier=Mouser
footprint CDRH127NP (Inductor)
pins: 1, 2

## CDRH127NP-680MC
designator H?  Supplier Part Number 1: 308-1475-1-ND
Ind Power Shielded Wirewound 68uH 20% 1KHz Ferrite 2.1A Carrier T/R; Manufacturer: Sumida; Manufacturer Part Number: CDRH127NP-680MC; DC Resistance (DCR): 140mR; Supplier 1: Digi-Key; RoHS: Yes; Category: Fixed Inductors; Stock 1: 311; Pricing 1: 1=2.10000, 10=1.93400, 25=1.77280, 50=1.51500, 100=1.35390, 250=1.16048 (USD); Mount: Surface Mount; Case/Package: Nonstandard; Core Material: Ferrite; Weight: 0.126986oz; Min Operating Temperature: -40°C; Max Operating Temperature: 100°C; Package Quantity: 500; Current Rating: 2.1A; Tolerance: 20%; Shielding: Shielded; Packaging: Tape and Reel; Inductance: 68uH; Test Frequency: 1kHz; Max DC Current: 2.1A; Termination: SMD/SMT; DC Current: 2.1A; Series: CDRH127; Rated Current-Max: 2.1A; Length: 12.3mm; Width: 0.472inch; Height: 8mm; Height - Seated (Max): 0.315inch; Depth: 12.3mm; Radiation Hardening: No; Military Standard: Not; Lead Free: Lead Free; RoHS Compliant: Yes; ComponentLink1URL: https://datasheet.ciiva.com/18233/getdatasheetpartid-359517-18233959.pdf?src-supplier=Verical; ComponentLink1Description: https://datasheet.ciiva.com/18233/getdatasheetpartid-359517-18233959.pdf?src-supplier=Verical
footprint CDRH127NP (Inductor)
pins: 1, 2

## CDRH127NP-681MC
designator H?  Supplier Part Number 1: CDRH127NP-681MC
FIXED IND 680UH 670MA 1.46 OHM; Manufacturer: Sumida; Core Material: Ferrite; Tolerance: 20%; Shielding: Shielded; DC Resistance (DCR): 1.46R; Test Frequency: 1kHz; Supplier 1: Avnet; Manufacturer Part Number: CDRH127NP-681MC; RoHS: Yes; Category: Fixed Inductors; Pricing 1: 500=0.87188, 1000=0.85960, 2000=0.83504, 3000=0.81662, 4000=0.78592, 5000=0.76750, 50000=0.61366 (USD); Mount: Surface Mount; Case/Package: Nonstandard; Min Operating Temperature: -40°C; Max Operating Temperature: 100°C; Package Quantity: 500; Packaging: Tape and Reel; Current Rating: 670mA; Inductance: 680uH; Max DC Current: 670mA; Termination: SMD/SMT; Series: CDRH127; Length: 0.472inch; Width: 12.3mm; Height: 8mm; Height - Seated (Max): 0.315inch; Depth: 12.3mm; Radiation Hardening: No; Lead Free: Lead Free; RoHS Compliant: Yes; ComponentLink1URL: http://www.sumida.com/products/pdf/CDRH127.pdf?src-supplier=Avnet; ComponentLink1Description: http://www.sumida.com/products/pdf/CDRH127.pdf?src-supplier=Avnet; ComponentLink2URL: http://www.sumida.com/products/pdf/CDRH127,127LD.pdf?src-supplier=Mouser; ComponentLink2Description: http://www.sumida.com/products/pdf/CDRH127,127LD.pdf?src-supplier=Mouser; ComponentLink3URL: http://products.sumida.com/products/pdf/CDRH127.pdf?src-supplier=Digi-Key; ComponentLink3Description: http://products.sumida.com/products/pdf/CDRH127.pdf?src-supplier=Digi-Key
footprint CDRH127NP (Inductor)
pins: 1, 2

## CDRH127NP-820MC
designator H?  Supplier Part Number 1: 4556098
Ind Power Shielded Wirewound 82uH 20% 1KHz Ferrite 1.95A Carrier T/R; Manufacturer: Sumida; Manufacturer Part Number: CDRH127NP-820MC; DC Resistance (DCR): 160mR; Supplier 1: Future Electronics; RoHS: Yes; Category: Fixed Inductors; Pricing 1: 500=1.27000, 1000=1.25000, 1500=1.23000 (USD); Mount: Surface Mount; Case/Package: Nonstandard; Core Material: Ferrite; Weight: 0.126986oz; Min Operating Temperature: -40°C; Max Operating Temperature: 100°C; Package Quantity: 1; Packaging: Tape and Reel; Tolerance: 20%; Shielding: Shielded; Current Rating: 1.95A; Inductance: 82uH; Max DC Current: 1.95A; Termination: SMD/SMT; Test Frequency: 1kHz; Length: 0.472inch; Width: 12.3mm; Height: 8mm; Height - Seated (Max): 0.315inch; Depth: 12.3mm; Radiation Hardening: No; Lead Free: Lead Free; ComponentLink1URL: http://www.sumida.com/products/pdf/CDRH127.pdf?src-supplier=Mouser; ComponentLink1Description: http://www.sumida.com/products/pdf/CDRH127.pdf?src-supplier=Mouser; ComponentLink2URL: http://www.sumida.com/products/pdf/CDRH127,127LD.pdf?src-supplier=Future+Electronics; ComponentLink2Description: http://www.sumida.com/products/pdf/CDRH127,127LD.pdf?src-supplier=Future+Electronics; ComponentLink3URL: http://products.sumida.com/products/pdf/CDRH127.pdf?src-supplier=Digi-Key; ComponentLink3Description: http://products.sumida.com/products/pdf/CDRH127.pdf?src-supplier=Digi-Key; ComponentLink4URL: http://www.sumida.com/products/pdf/CDRH127.pdf?src-supplier=Avnet; ComponentLink4Description: http://www.sumida.com/products/pdf/CDRH127.pdf?src-supplier=Avnet
footprint CDRH127NP (Inductor)
pins: 1, 2

## CDRH127NP-821MC
designator H?  Supplier Part Number 1: CDRH127NP-821MC
FIXED IND 820UH 600MA 1.64 OHM; Manufacturer: Sumida; Core Material: Ferrite; Tolerance: 20%; Shielding: Shielded; DC Resistance (DCR): 1.64R; Test Frequency: 1kHz; Supplier 1: Avnet; Manufacturer Part Number: CDRH127NP-821MC; RoHS: Yes; Category: Fixed Inductors; Pricing 1: 500=0.87188, 1000=0.85960, 2000=0.83504, 3000=0.81662, 4000=0.78592, 5000=0.76750, 50000=0.61366 (USD); Mount: Surface Mount; Case/Package: Nonstandard; Weight: 0.126986oz; Min Operating Temperature: -40°C; Max Operating Temperature: 100°C; Package Quantity: 500; Packaging: Tape and Reel; Current Rating: 600mA; Inductance: 820uH; Max DC Current: 600mA; Termination: SMD/SMT; Series: CDRH127; Length: 0.472inch; Width: 12.3mm; Height: 8mm; Height - Seated (Max): 0.315inch; Depth: 12.3mm; Radiation Hardening: No; Lead Free: Lead Free; RoHS Compliant: Yes; ComponentLink1URL: http://www.sumida.com/products/pdf/CDRH127.pdf?src-supplier=Mouser; ComponentLink1Description: http://www.sumida.com/products/pdf/CDRH127.pdf?src-supplier=Mouser; ComponentLink2URL: http://www.sumida.com/products/pdf/CDRH127.pdf?src-supplier=Avnet; ComponentLink2Description: http://www.sumida.com/products/pdf/CDRH127.pdf?src-supplier=Avnet; ComponentLink3URL: http://products.sumida.com/products/pdf/CDRH127.pdf?src-supplier=Digi-Key; ComponentLink3Description: http://products.sumida.com/products/pdf/CDRH127.pdf?src-supplier=Digi-Key
footprint CDRH127NP (Inductor)
pins: 1, 2

## CH340G
designator U?
USB2UART
footprint SOP16
pins: 1 GND (power), 2 TXD (out), 3 RXD (in), 4 V3 (power), 5 UD+ (io), 6 UD- (io), 7 XI (in), 8 XO (out), 9 CTS# (in), 10 DSR# (in), 11 RI# (in), 12 DCD# (in), 13 DTR# (out), 14 RTS# (out), 15 R232 (in), 16 VCC (power)

## CP2102-GM
designator U?
Vendor: Silicon Labs; Built_By: EMA_UL_Team; SourceLibrary: Silicon_Labs_2015-03-23; Manufacturer_Part_Number: CP2102-GM; Copyright: Copyright (C) 2018 Accelerated Designs. All rights reserved; RefDes: RefDes; Type: DEV; Local Supplier: thegioiic; Local Supplier Part Number: *; Local Supplier Link: https://www.thegioiic.com/products/cp2102
footprint QFN28_5X5_SIL
pins: 1 DCD (in), 2 RI (in), 3 GND (power), 4 D+ (io), 5 D- (io), 6 VDD (power), 7 REGIN (in), 8 VBUS (in), 9 ~{RST} (io), 10 NC, 11 ~{SUSPEND} (out), 12 SUSPEND (out), 13 NC, 14 NC, 15 NC, 16 NC, 17 NC, 18 NC/VPP (io), 19 NC, 20 NC, 21 NC, 22 NC, 23 CTS, 24 RTS, 25 RXD, 26 TXD, 27 DSR, 28 DTR, 29 EPAD

## CR2032 - BS-7-RED
designator BAT?  Supplier Part Number 1: BS-7-RED-ND
HOLDER CR2032; Manufacturer: Memory Protection Devices; Manufacturer Part Number: BS-7-RED; Number of Cells: 1; Supplier 1: Digi-Key; RoHS: Yes; Category: Uncategorized; Stock 1: 381; Pricing 1: 1=1.17000, 10=0.98600, 50=0.86740, 100=0.81750, 300=0.75223 (USD); Mount: Surface Mount,PCB; Min Operating Temperature: -55°C; Max Operating Temperature: 105°C; Termination: SMD/SMT; Package Quantity: 100; ComponentLink1URL: https://datasheet.ciiva.com/6420/bs-7-red-datasheet-6420083.pdf?src-supplier=Digi-Key; ComponentLink1Description: https://datasheet.ciiva.com/6420/bs-7-red-datasheet-6420083.pdf?src-supplier=Digi-Key
footprint CR2032
pins: 1 PWR (power), 2 GND (power)

## Crystal - MC-14632.7680KA-AC3:ROHS
designator Y?, comment 2 3 TO GND
Crystals 32.768KHz 20ppm 9pF -40C +85C
footprint MC-146 (Thach Anh 32.768KHz)
pins: 1, 2, 3, 4 7

## Crystals - HC49SSDLF-8.00MHz
designator Y?  Supplier Part Number 1: 559-280LF-080
Crystals LO-PRO 8MHz; Manufacturer: Fox Electronics; Manufacturer Part Number: HC49SSDLF-8.00MHz; Supplier 1: Mouser; RoHS: Yes; Category: Uncategorized; Frequency: 8MHz; Packaging: Tape and Reel; Package Quantity: 1000; Termination: SMD/SMT; Length: 13.2mm; Width: 5mm; Height: 3.2mm; ComponentLink1URL: https://datasheet.ciiva.com/12388/hc49ssdlf-16337-12388064.pdf?src-supplier=Mouser; ComponentLink1Description: https://datasheet.ciiva.com/12388/hc49ssdlf-16337-12388064.pdf?src-supplier=Mouser
footprint HC49-S (Crystal SMD)
pins: 1 6, 2 7

## DCIN_5.5/2.1
designator P?
footprint DCIN_5.5/2.1 (DCInput _ 5.5/2.1)
pins: 1 +, 2 NC, 3 -

## Domino 15EDG-3.81-02P
designator P?
footprint Domino 15EDG3.81 2P
pins: 1, 2

## Domino 15EDG-3.81-03P
designator P?
footprint Domino 15EDG3.81 3P
pins: 1, 2, 3

## DOMINO_2P
designator P?
DOMINO 2 PHASE
footprint DOMINO_2PIN_5.08MM_KF2EDG (KF2EDG)
footprint DOMINO_2P_FK128 (DOMINO 2P FK128)
footprint DOMINO_2P_KF301 (DOMINO 2P KF301)
pins: 1, 2

## DOMINO_3P
designator P?
DOMINO_3P
footprint DOMINO_3P_FK128 (DOMINO 3P FK128)
footprint DOMINO_3P_KF301 (DOMINO 3P KF301)
pins: 1, 2, 3

## DOMINO_4P
designator P?
footprint DOMINO_4PIN_5.08MM_KF2EDG (KF2EDG)
footprint DOMINO_4P_FK128 (DOMINO 3P FK128)
pins: 1, 2, 3, 4

## DOMINO_5P
designator P?
footprint DOMINO_5PIN_5.08MM_KF2EDG (KF2EDG)
pins: 1, 2, 3, 4, 5

## DOMINO_6P
designator P?
footprint DOMINO_6PIN_5.08MM_KF2EDG (KF2EDG)
pins: 1, 2, 3, 4, 5, 6

## DRV8825
designator M?
Local Supplier: thegioiic; Local Supplier Link: https://www.thegioiic.com/products/stepstick-drv8825-mach-dieu-khien-dong-co-buoc; Local Supplier Part Number: *
footprint DRV8825
pins: 1 DIR, 2 STEP, 3 ~{SLEEP}, 4 ~{RESET}, 5 M2, 6 M1, 7 M0, 8 ~{ENABLE}, 9 VMOT, 10 GND MOT, 11 B2, 12 B1, 13 A1, 14 A2, 15 ~{FAULT}, 16 GND LOGIC

## DS3231SN#
designator U?  Supplier Part Number 1: 81Y9084
DS3231 Series 5.5 V Extremely Accurate I2C-Integrated RTC/TCXO/Crystal - SOIC-16; Manufacturer: Maxim; Manufacturer Part Number: DS3231SN#; Logic Function: Clock; Time Format: HH:MM:SS; Max Supply Voltage: 5.5V; Min Supply Voltage: 2.3V; Operating Supply Voltage: 3.3V; Interface: I2C,Serial,2-Wire; Date Format: YY-MM-DD-dd; Number of Outputs: 1; Frequency: 32.768kHz; Supplier 1: Newark; RoHS: Yes; Category: Real Time Clocks; Pricing 1: 1=11.12000, 10=10.69000, 25=10.25000, 138=9.03000, 276=8.59000, 506=8.31000 (USD); Mount: Surface Mount; Case/Package: SOIC; Number of Pins: 16; Weight: 0.023492oz; Min Operating Temperature: -40°C; Max Operating Temperature: 85°C; Package Quantity: 46; Packaging: Bulk; Series: DS3231SN; Termination: SMD/SMT; Length: 10.5mm; Width: 7.6mm; Height: 2.35mm; Radiation Hardening: No; RoHS Compliant: Yes; Lead Free: Lead Free; ComponentLink1URL: https://datasheet.ciiva.com/1139/1675711-1139210.pdf?src-supplier=Element14; ComponentLink1Description: https://datasheet.ciiva.com/1139/1675711-1139210.pdf?src-supplier=Element14; ComponentLink2URL: https://datasheet.ciiva.com/23867/45724-23867216.pdf?src-supplier=Newark; ComponentLink2Description: https://datasheet.ciiva.com/23867/45724-23867216.pdf?src-supplier=Newark; ComponentLink3URL: https://datasheet.ciiva.com/1146/ds3231-1146707.pdf?src-supplier=Newark; ComponentLink3Description: https://datasheet.ciiva.com/1146/ds3231-1146707.pdf?src-supplier=Newark; ComponentLink4URL: https://datasheet.ciiva.com/1240/ds3231-ds3231s-1240689.pdf?src-supplier=Digi-Key; ComponentLink4Description: https://datasheet.ciiva.com/1240/ds3231-ds3231s-1240689.pdf?src-supplier=Digi-Key; ComponentLink5URL: https://datasheet.ciiva.com/4772/ds3231-102175-4772091.pdf?src-supplier=Mouser; ComponentLink5Description: https://datasheet.ciiva.com/4772/ds3231-102175-4772091.pdf?src-supplier=Mouser; ComponentLink6URL: https://datasheet.ciiva.com/12291/ds3231-102175-12291423.pdf?src-supplier=Mouser; ComponentLink6Description: https://datasheet.ciiva.com/12291/ds3231-102175-12291423.pdf?src-supplier=Mouser; ComponentLink7URL: https://datasheet.ciiva.com/14244/ds3231-14244059.pdf?src-supplier=Avnet; ComponentLink7Description: https://datasheet.ciiva.com/14244/ds3231-14244059.pdf?src-supplier=Avnet
footprint SOIC-16W
pins: 1 32kHz, 2 VCC (power), 3 INT, 4 RST, 5 NC, 6 NC, 7 NC, 8 NC, 9 NC, 10 NC, 11 NC, 12 NC, 13 GND (power), 14 VBAT (power), 15 SDA, 16 SCL
